# Altium footprint library 我的元件库02.PcbLib: 300 footprints (part 8 of 19)
Each footprint in its own frame and in the unit in brackets; x right, y up, seen from the top. Pads: shape width x height; smd on the part's side, far side on the other; paste and mask are expansions set on the pad; w line width, h text height; cw(c..) or ccw(c..) is an arc to the next point about the centre after c.
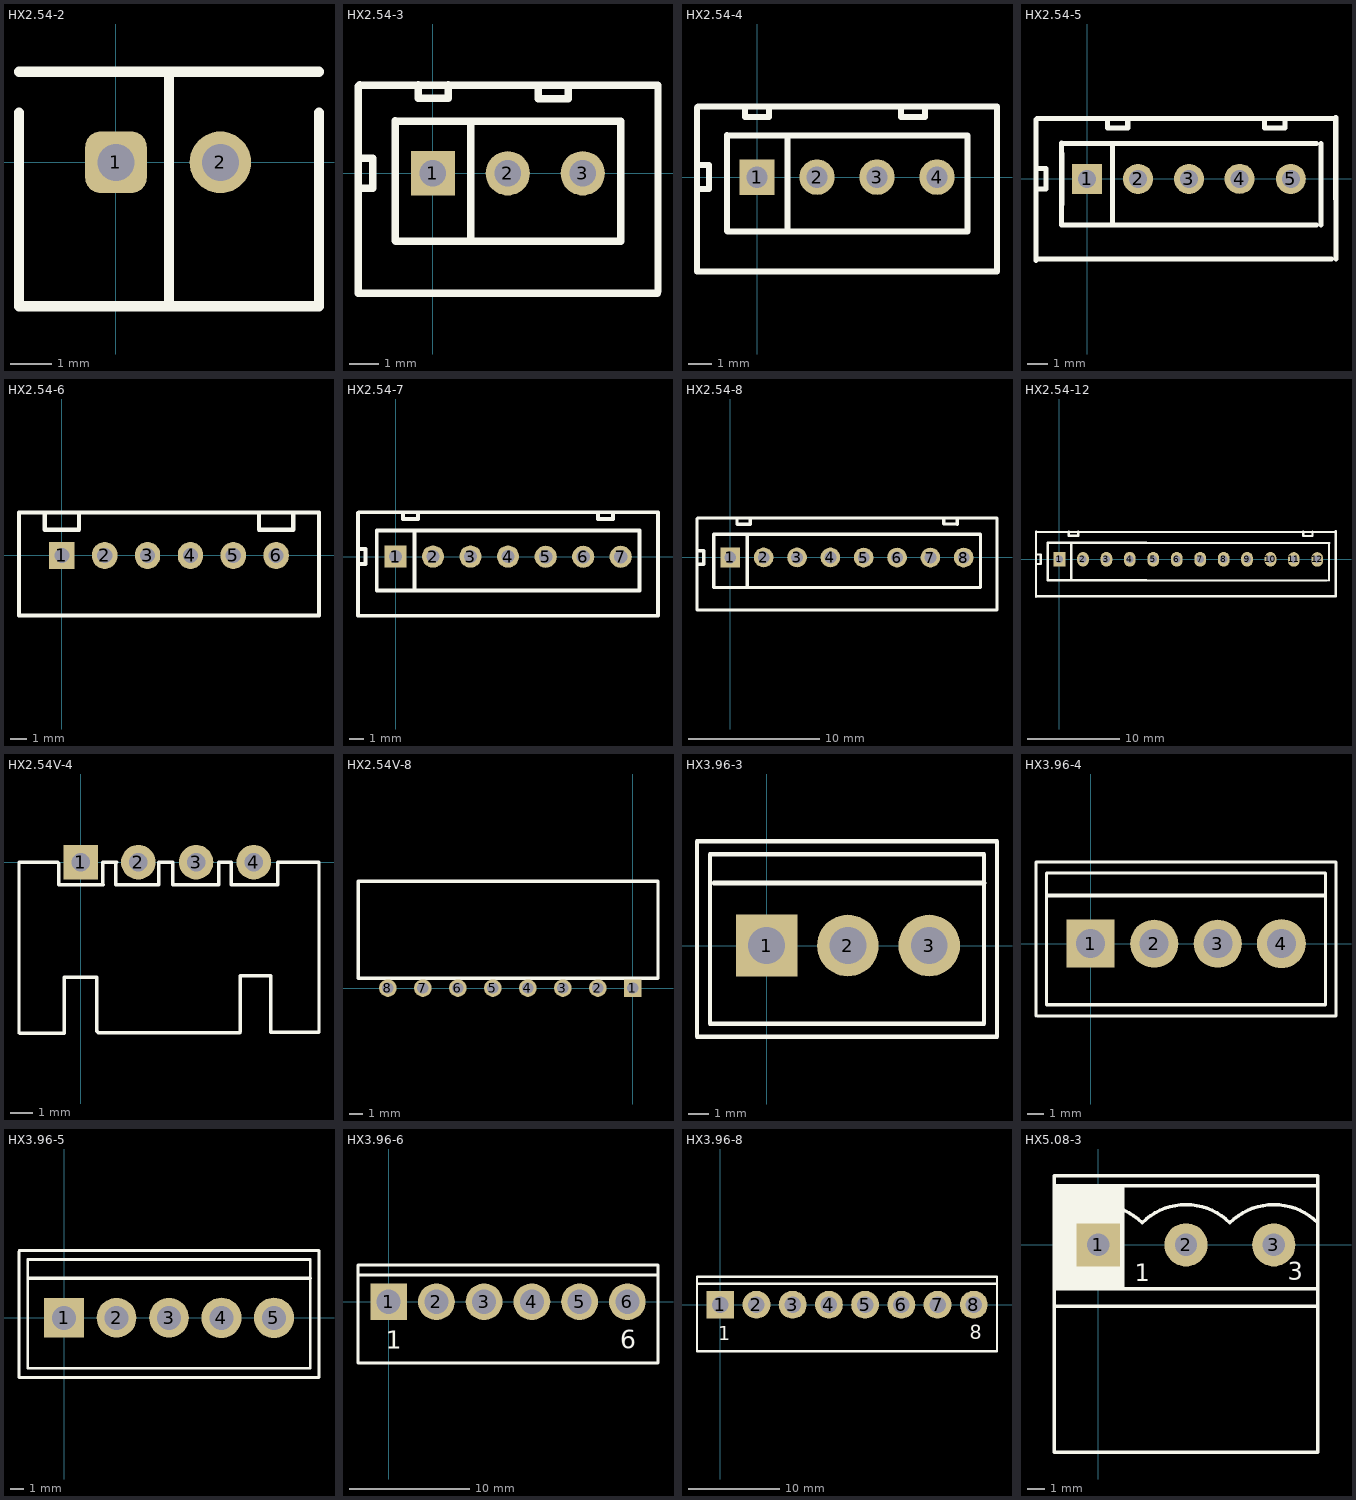
[diagram p7: the footprints below, top view; thin cyan lines are the x and y axes]

## HX2.54-2 [mm] "两针白色插座（已加焊）"
pads (2):
  rrect50% 1.5x1.5 hole 0.9: 1(0,0)
  round 1.5 hole 0.9: 2(2.54,0)
Top Overlay:
  lines w0.254: -2.36,1.206 -2.36,-3.5 4.94,-3.5 4.94,1.206 ; -2.36,2.2 4.94,2.2 ; 1.29,-3.5 1.29,2.2
3D body: height 7, standoff -3, extent -2.48,-3.55 5.02,2.45

## HX2.54-3 [mm]
pads (3):
  rect 1.5x1.5 hole 0.9: 1(0,0)
  round 1.5 hole 0.9: 2(2.54,0) 3(5.08,0)
Top Overlay:
  lines w0.254: -2.54,-0.508 -2.032,-0.508 -2.032,0.508 -2.54,0.508 ; -2.536,2.54 -2.536,2.95 ; -2.496,2.995 7.633,2.995 7.633,-4.005 ; -1.27,-2.286 -1.27,1.778 ; -1.257,-2.296 6.363,-2.296 ; -1.257,1.768 6.375,1.768 ; -0.504,2.998 -0.504,2.538 0.512,2.538 0.512,2.998 ; 1.283,-2.296 1.283,1.768 ; 3.573,2.995 3.573,2.535 4.589,2.535 4.589,2.995 ; 6.375,-2.299 6.375,1.765 ; 7.607,-4.061 -2.536,-4.061 -2.536,2.95 ; -2.536,2.95 -2.488,2.998 -2.536,2.95
3D body: height 7, standoff -3, extent -2.409,-3.581 7.591,2.419

## HX2.54-4 [mm]
pads (4):
  rect 1.5x1.5 hole 0.9: 1(0,0)
  round 1.5 hole 0.9: 2(2.54,0) 3(5.08,0) 4(7.62,0)
Top Overlay:
  lines w0.254: -2.54,-0.508 -2.032,-0.508 -2.032,0.508 -2.54,0.508 ; -2.536,-4.002 -2.536,2.95 ; -2.472,-4.002 -2.092,-4.002 10.16,-4.002 10.16,2.998 -2.488,2.998 ; -1.27,-2.286 -1.27,1.778 ; -1.257,-2.296 8.903,-2.296 8.903,1.768 -1.257,1.768 ; -0.504,2.998 -0.504,2.538 0.512,2.538 0.512,2.998 ; 1.283,-2.296 1.283,1.768 ; 6.1,2.998 6.1,2.538 7.116,2.538 7.116,2.998 ; -2.536,2.95 -2.488,2.998 ; -2.536,2.95 -2.488,2.998
3D body: height 7, standoff -3, extent -2.399,-3.562 10.121,2.438

## HX2.54-5 [mm]
pads (5):
  rect 1.5x1.5 hole 0.9: 1(0,0)
  round 1.5 hole 0.9: 2(2.54,0) 3(5.08,0) 4(7.607,0.006) 5(10.16,0)
Top Overlay:
  lines w0.254: -2.553,-0.502 -2.045,-0.502 -2.045,0.514 -2.553,0.514 ; -2.491,-3.996 12.179,-3.996 ; -2.104,-3.996 -2.484,-3.996 -2.548,-4.06 -2.548,-2.028 -2.548,2.956 -2.5,3.004 12.416,3.014 ; -1.283,-2.28 -1.283,1.784 ; -1.27,-2.29 11.43,-2.29 ; -1.27,-1.27 -1.27,1.27 ; -1.27,1.774 11.43,1.774 ; 1.008,3.004 1.008,2.544 2.024,2.544 2.024,3.004 ; 1.27,-2.29 1.27,1.774 ; 1.27,-1.27 1.27,1.27 ; 8.856,3.004 8.856,2.544 9.872,2.544 9.872,3.004 ; 11.659,-2.29 11.659,1.774 ; 12.403,-1.01 12.403,3.054 ; 12.408,-3.996 12.408,0.004
3D body: height 7.51, standoff -2.49, extent -2.562,-3.562 12.518,2.438

## HX2.54-6 [mm]
pads (6):
  rect 1.5x1.6 hole 0.9: 1(0,0)
  oval 1.5x1.6 hole 0.9: 2(2.54,0) 3(5.08,0) 4(7.62,0) 5(10.16,0) 6(12.7,0)
Top Overlay:
  lines w0.254: -1.016,2.54 -1.016,1.524 1.016,1.524 1.016,2.54 ; 11.684,2.54 11.684,1.524 13.716,1.524 13.716,2.54 ; -2.54,-3.556 15.24,-3.556 15.24,2.54 -2.54,2.54 -2.54,-3.556

## HX2.54-7 [mm]
pads (7):
  rect 1.5x1.5 hole 0.9: 1(0,0)
  round 1.5 hole 0.9: 2(2.54,0) 3(5.08,0) 4(7.62,0) 5(10.173,-0.01) 6(12.713,-0.01) 7(15.253,-0.01)
Top Overlay:
  lines w0.254: -2.54,-0.508 -2.032,-0.508 -2.032,0.508 -2.54,0.508 ; -1.257,-2.296 16.523,-2.296 16.523,1.768 -1.257,1.768 ; 0.512,2.998 0.512,2.538 1.528,2.538 1.528,2.998 ; 1.283,-2.296 1.283,1.768 ; 9.398,-2.286 -1.27,-2.286 -1.27,1.778 9.398,1.778 ; 13.72,2.998 13.72,2.538 14.736,2.538 14.736,2.998 ; 17.776,-4.002 17.776,2.998 ; 17.78,-4.002 -2.536,-4.002 -2.536,2.95 -2.488,2.998 17.78,2.998

## HX2.54-8 [mm]
pads (8):
  rect 1.5x1.5 hole 0.9: 1(0,0)
  round 1.5 hole 0.9: 2(2.54,0) 3(5.08,0) 4(7.62,0) 5(10.16,-0.01) 6(12.7,-0.01) 7(15.24,-0.01) 8(17.78,-0.01)
Top Overlay:
  lines w0.254: -2.54,-0.508 -2.032,-0.508 -2.032,0.508 -2.54,0.508 ; 0.512,2.998 0.512,2.538 1.528,2.538 1.528,2.998 ; 1.283,-2.296 1.283,1.768 ; 16.256,3 16.256,2.54 17.272,2.54 ; 17.276,2.538 17.276,2.998 ; 19.063,-2.296 19.063,1.768 ; 19.063,-2.286 -1.27,-2.286 -1.27,1.778 19.063,1.778 ; -2.536,-4.002 -2.536,2.95 -2.488,2.998 20.316,2.998 20.316,-4.002 -2.536,-4.002

## HX2.54-12 [mil]
pads (12):
  rect 50x62 hole 32: 1(0,0)
  oval 50x62 hole 32: 2(100.5,0.5) 3(200.5,0.5) 4(300,0.73) 5(400.5,0.5) 6(500.5,0.5) 7(600.5,0.5) 8(700.5,0.5) 9(800.5,0.5) 10(900.5,0.5) 11(1000,0) 12(1100,0)
Top Overlay:
  lines w10: -100,-19.26 -80,-19.26 -80,20.74 -100,20.74 ; -97.94,118.76 -99.83,116.87 ; -97.57,-156.83 1180,-156.83 ; -82.35,-156.83 -97.31,-156.83 -99.83,-159.35 -99.83,-79.35 -99.83,116.87 ; -49.5,-89.66 1141,-89.66 ; -49.5,70.34 1150.5,70.34 ; 40.17,118.76 40.17,100.65 80.17,100.65 80.17,118.76 ; 50.5,-89.66 50.5,70.34 ; 370,-89.26 -50,-89.26 -50,70.74 370,70.74 ; 1039.67,118.26 1039.67,100.15 1079.67,100.15 1079.67,118.26 ; 1150,-90.16 1150,69.84 ; 1175.96,116.87 -99.83,116.87 ; 1179.33,-39.76 1179.33,120.24 ; 1179.5,-157.33 1179.5,0.15 ; -49.5,-49.5 -49.5,50.5 -49.5,-49.5 ; 50.5,-49.5 50.5,50.5 50.5,-49.5

## HX2.54V-4 [mil]
pads (4):
  rect 60x60 hole 32: 1(0,0)
  round 60 hole 32: 2(100,0) 3(200,0) 4(300,0)
Top Overlay:
  lines w6.06: 26.14,-199.13 -28.11,-199.13 -28.11,-296.38 -105.91,-296.38 -106.93,-295.35 -106.93,0 -40,0 -38.35,-1.65 -38.35,-38.66 -37.8,-39.21 39.21,-39.21 38.66,-38.66 38.66,0 ; 28.19,-199.13 28.19,-293.31 30.24,-295.35 275.91,-295.35 276.93,-294.33 276.93,-198.11 ; 40,0 62.2,0 ; 61.18,0 61.18,-39.45 134.65,-39.45 135.2,-38.9 135.2,0 ; 135.67,0 159.21,0 ; 159.76,-39.21 159.76,0 ; 160.55,-39.21 238.82,-39.21 239.06,-38.98 239.06,0 260.55,0 ; 261.1,0 261.1,-39.45 341.97,-39.45 ; 276.93,-197.09 329.13,-197.09 329.61,-197.56 329.61,-294.88 413.07,-294.88 413.07,0 343.54,0 ; 341.97,-38.43 341.97,0

## HX2.54V-8 [mil]
pads (8):
  rect 50x50 hole 32: 1(0,0)
  round 50 hole 32: 2(-100,0) 3(-200,0) 4(-300,0) 5(-400,0) 6(-500,0) 7(-600,0) 8(-700,0)
Top Overlay:
  lines w10: -785.25,305.32 72,305.65 72,30 ; -784.92,28.05 71.08,28.05 ; -784.84,28.05 -784.84,305.73 ; -782.92,28.05 -766.92,28.05

## HX3.96-3 [mm]
pads (3):
  rect 3x3 hole 1.8: 1(0,0)
  round 3 hole 1.8: 2(3.96,0) 3(7.92,0)
Top Overlay:
  lines w0.203: -3.387,-4.445 11.218,-4.445 11.218,5.08 -3.387,5.08 -3.387,-4.445 ; -2.752,-3.81 10.583,-3.81 10.583,4.445 -2.752,4.445 -2.752,-3.81
  lines w0.254: -2.547,3.048 10.583,3.048

## HX3.96-4 [mm]
pads (4):
  rect 3x3 hole 1.8: 1(0,0)
  round 3 hole 1.8: 2(3.96,0) 3(7.92,0)
  round 3.048 hole 1.8: 4(11.88,0)
Top Overlay:
  lines w0.203: -3.4,-4.5 -3.4,5 ; -3.387,5.08 15.28,5.08 15.28,-4.445 ; -3.3,-4.5 15.28,-4.5 ; 14.6,-3.8 -2.75,-3.8 -2.75,4.4 14.6,4.4 ; 14.63,-3.8 14.63,4.4
  lines w0.254: -2.7,3 14.6,3

## HX3.96-5 [mm]
pads (5):
  rect 3x3 hole 1.8: 1(0,0)
  round 3 hole 1.8: 2(3.96,0) 3(7.92,0)
  round 3.048 hole 1.8: 4(11.88,0) 5(15.84,0)
Top Overlay:
  lines w0.203: -3.4,-4.5 -3.4,5 ; -3.387,5.08 19.24,5.08 19.24,-4.445 ; -3.3,-4.5 19.24,-4.5 ; -2.75,-3.8 18.59,-3.8 18.59,4.4 -2.75,4.4 -2.75,-3.8
  lines w0.254: -2.7,3 18.59,3

## HX3.96-6 [mil]
pads (6):
  rect 120x120 hole 78.74: 1(0,0)
  round 120 hole 78.74: 2(155.91,0) 3(311.81,0) 4(467.72,0) 5(623.62,0) 6(779.53,0)
Top Overlay:
  lines w10: -100,88 879.53,88 ; -100,-200 -100,120 879.53,120 879.53,-200 -100,-200
  text "6" at 757,-152 h60
  text "1" at -10,-153 h60

## HX3.96-8 [mil]
pads (8):
  rect 120x120 hole 70.87: 1(0,0)
  round 120 hole 70.87: 2(155.91,0) 3(311.81,0) 4(467.72,0) 5(623.62,0) 6(779.53,0) 7(935.43,0) 8(1091.34,0)
Top Overlay:
  lines w10: -100,90 1191.34,90 ; -100,-200 -100,120 1191.34,120 1191.34,-200 -100,-200
  text "1" at -9,-152 h60
  text "8" at 1075,-149 h60

## HX5.08-3 [mm]
pads (3):
  rect 2.5x2.5 hole 1.3: 1(0,0)
  round 2.5 hole 1.3: 2(5.08,0) 3(10.16,0)
Top Overlay:
  rectangle: -2.54,-2.54 1.524,3.429
  lines w0.203: -2.544,1.274 cw(c0,-1.27) 2.544,1.274 ; -2.54,-3.556 12.7,-3.556 ; -2.54,-2.54 12.7,-2.54 ; -2.54,3.429 12.7,3.429 ; 2.536,1.274 cw(c5.08,-1.27) 7.624,1.274 ; 7.616,1.274 cw(c10.16,-1.27) 12.704,1.274 ; -2.54,-12 -2.54,4 12.7,4 12.7,-12 -2.54,-12
  text "1" at 2.108,-2.108 h1.02
  text "3" at 10.973,-2.032 h1.02